# Altium footprint library 6-Connectors-3.PcbLib: 153 footprints (part 6 of 11) (continued)
## PHOENIX_1777099 [mm] "PCB Header, 12A, 320V, Pitch: 5.08mm, 4 Positions, MSTBV Serie" (continued)
  text "1" at -7.76,3.505 h0.75
  text "2" at -2.76,3.505 h0.75
  text "3" at 2.311,3.505 h0.75
  text "4" at 7.366,3.505 h0.75
3D body "PHOENIX_1777099.stp": height 12, standoff -3.9, extent -15.24,-3.8 15.24,4.8

## PHOENIX_1777125 [mm] "PCB Header, 12A, 320V, Pitch: 5.08mm, 7 Positions, MSTBV Serie"
height 12
pads (9):
  round 2.1 hole 1.4: 1(-15.24,0) 2(-10.16,0) 3(-5.08,0) 4(0,0) 5(5.08,0) 6(10.16,0) 7(15.24,0)
  round 3.8 hole 2.4: P1(-20.32,0) P2(20.32,0)
Top Overlay:
  lines w0.2: -22.86,4.23 -16.215,4.23 ; -17.78,-2.2 -17.28,-2.2 ; -17.78,3.093 17.78,3.093 ; -15.884,3.093 -16.215,3.405 ; -14.596,3.093 -14.265,3.405 ; -10.804,3.093 -11.135,3.405 ; -9.516,3.093 -9.185,3.405 ; -5.724,3.093 -6.055,3.405 ; -4.436,3.093 -4.105,3.405 ; -0.644,3.093 -0.975,3.405 ; 0.644,3.093 0.975,3.405 ; 4.436,3.093 4.105,3.405 ; 5.724,3.093 6.055,3.405 ; 9.516,3.093 9.185,3.405 ; 10.804,3.093 11.135,3.405 ; 14.596,3.093 14.265,3.405 ; 15.884,3.093 16.215,3.405 ; 17.78,-2.2 17.28,-2.2 ; 22.86,4.23 16.215,4.23 ; -17.394,-2.5 ccw(c-15.24,0) -13.086,-2.5 ; -17.394,-2.5 -17.28,-2.2 ; -17.394,-2.5 -17.78,-2.5 -17.78,3.405 -16.215,3.405 ; -17.28,-2.2 ccw(c-15.24,0) -13.2,-2.2 ; -16.215,3.405 -16.215,4.23 ; -16.215,4.23 -15.845,4.703 -14.635,4.703 -14.265,4.23 ; -14.265,3.405 -14.265,4.23 ; -14.265,3.405 -11.135,3.405 ; -14.265,4.23 -11.135,4.23 ; -13.2,-2.2 -12.2,-2.2 ; -13.2,-2.2 -13.086,-2.5 ; -13.086,-2.5 -12.314,-2.5 ; -12.314,-2.5 ccw(c-10.16,0) -8.006,-2.5 ; -12.314,-2.5 -12.2,-2.2 ; -12.2,-2.2 ccw(c-10.16,0) -8.12,-2.2 ; -11.135,3.405 -11.135,4.23 ; -11.135,4.23 -10.765,4.703 -9.555,4.703 -9.185,4.23 ; -9.185,3.405 -9.185,4.23 ; -9.185,3.405 -6.055,3.405 ; -9.185,4.23 -6.055,4.23 ; -8.12,-2.2 -8.006,-2.5 ; -8.12,-2.2 -7.12,-2.2 ; -8.006,-2.5 -7.234,-2.5 ; -7.234,-2.5 ccw(c-5.08,0) -2.926,-2.5 ; -7.234,-2.5 -7.12,-2.2 ; -7.12,-2.2 ccw(c-5.08,0) -3.04,-2.2 ; -6.055,3.405 -6.055,4.23 ; -6.055,4.23 -5.685,4.703 -4.475,4.703 -4.105,4.23 ; -4.105,3.405 -4.105,4.23 ; -4.105,3.405 -0.975,3.405 ; -4.105,4.23 -0.975,4.23 ; -3.04,-2.2 -2.926,-2.5 ; -3.04,-2.2 -2.04,-2.2 ; -2.926,-2.5 -2.154,-2.5 ; -2.154,-2.5 ccw(c0,0) 2.154,-2.5 ; -2.154,-2.5 -2.04,-2.2 ; -2.04,-2.2 ccw(c0,0) 2.04,-2.2 ; -0.975,3.405 -0.975,4.23 ; -0.975,4.23 -0.605,4.703 0.605,4.703 0.975,4.23 ; 0.975,3.405 0.975,4.23 ; 0.975,3.405 4.105,3.405 ; 0.975,4.23 4.105,4.23 ; 2.04,-2.2 2.154,-2.5 ; 2.04,-2.2 3.04,-2.2 ; 2.154,-2.5 2.926,-2.5 ; 2.926,-2.5 ccw(c5.08,0) 7.234,-2.5 ; 2.926,-2.5 3.04,-2.2 ; 3.04,-2.2 ccw(c5.08,0) 7.12,-2.2 ; 4.105,3.405 4.105,4.23 ; 4.105,4.23 4.475,4.703 5.685,4.703 6.055,4.23 ; 6.055,3.405 9.185,3.405 ; 6.055,3.405 6.055,4.23 ; 6.055,4.23 9.185,4.23 ; 7.12,-2.2 8.12,-2.2 ; 7.12,-2.2 7.234,-2.5 ; 7.234,-2.5 8.006,-2.5 ; 8.006,-2.5 ccw(c10.16,0) 12.314,-2.5 ; 8.006,-2.5 8.12,-2.2 ; 8.12,-2.2 ccw(c10.16,0) 12.2,-2.2 ; 9.185,3.405 9.185,4.23 ; 9.185,4.23 9.555,4.703 10.765,4.703 11.135,4.23 ; 11.135,3.405 11.135,4.23 ; 11.135,3.405 14.265,3.405 ; 11.135,4.23 14.265,4.23 ; 12.2,-2.2 13.2,-2.2 ; 12.2,-2.2 12.314,-2.5 ; 12.314,-2.5 13.086,-2.5 ; 13.086,-2.5 ccw(c15.24,0) 17.394,-2.5 ; 13.086,-2.5 13.2,-2.2 ; 13.2,-2.2 ccw(c15.24,0) 17.28,-2.2 ; 14.265,3.405 14.265,4.23 ; 14.265,4.23 14.635,4.703 15.845,4.703 16.215,4.23 ; 16.215,3.405 16.215,4.23 ; 16.215,3.405 17.78,3.405 17.78,-2.5 17.394,-2.5 ; 17.28,-2.2 17.394,-2.5 ; -22.86,-3.87 22.86,-3.87 22.86,4.73 -22.86,4.73 -22.86,-3.87 ; -12.901,-0.75 -12.499,-0.75 -12.7,0 -12.901,-0.75 ; -7.821,-0.75 -7.419,-0.75 -7.62,0 -7.821,-0.75 ; -2.741,-0.75 -2.339,-0.75 -2.54,0 -2.741,-0.75 ; 2.339,-0.75 2.741,-0.75 2.54,0 2.339,-0.75 ; 7.419,-0.75 7.821,-0.75 7.62,0 7.419,-0.75 ; 12.499,-0.75 12.901,-0.75 12.7,0 12.499,-0.75
  text "5" at 4.877,3.505 h0.75
  text "4" at -0.254,3.505 h0.75
  text "3" at -5.309,3.505 h0.75
  text "2" at -10.38,3.505 h0.75
  text "1" at -15.38,3.505 h0.75
  text "6" at 9.957,3.505 h0.75
  text "7" at 15.037,3.505 h0.75
Mechanical 8:
  lines w0.1: -20.82,0 -20.32,0 ; -20.32,-0.5 -20.32,0 ; -20.32,0.5 -20.32,0 ; -19.82,0 -20.32,0 ; -15.74,0 -15.24,0 ; -15.24,-0.5 -15.24,0 ; -15.24,0.5 -15.24,0 ; -14.74,0 -15.24,0 ; -10.66,0 -10.16,0 ; -10.16,-0.5 -10.16,0 ; -10.16,0.5 -10.16,0 ; -9.66,0 -10.16,0 ; -5.58,0 -5.08,0 ; -5.08,-0.5 -5.08,0 ; -5.08,0.5 -5.08,0 ; -4.58,0 -5.08,0 ; -0.5,0 0,0 ; 0,-0.5 0,0 ; 0,0.5 0,0 ; 0.5,0 0,0 ; 4.58,0 5.08,0 ; 5.08,-0.5 5.08,0 ; 5.08,0.5 5.08,0 ; 5.58,0 5.08,0 ; 9.66,0 10.16,0 ; 10.16,-0.5 10.16,0 ; 10.16,0.5 10.16,0 ; 10.66,0 10.16,0 ; 14.74,0 15.24,0 ; 15.24,-0.5 15.24,0 ; 15.24,0.5 15.24,0 ; 15.74,0 15.24,0 ; 19.82,0 20.32,0 ; 20.32,-0.5 20.32,0 ; 20.32,0.5 20.32,0 ; 20.82,0 20.32,0
Mechanical 14:
  drawing of 228 lines, arcs and shapes, not listed
  text "7" at 15.037,3.505 h0.75
  text "6" at 9.957,3.505 h0.75
  text "1" at -15.38,3.505 h0.75
  text "2" at -10.38,3.505 h0.75
  text "3" at -5.309,3.505 h0.75
  text "4" at -0.254,3.505 h0.75
  text "5" at 4.877,3.505 h0.75
3D body "PHOENIX_1777125.stp": height 12, standoff -3.9, extent -22.86,-3.8 22.86,4.8

## PHOENIX_1777170 [mm] "PCB Header, 12A, 320V, Pitch: 5.08mm, 12 Positions, MSTBV Serie"
height 12
pads (14):
  round 2.1 hole 1.4: 1(-27.94,0) 2(-22.86,0) 3(-17.78,0) 4(-12.7,0) 5(-7.62,0) 6(-2.54,0) 7(2.54,0) 8(7.62,0) 9(12.7,0) 10(17.78,0) 11(22.86,0) 12(27.94,0)
  round 3.8 hole 2.4: P1(-33.02,0) P2(33.02,0)
Top Overlay:
  drawing of 224 lines, arcs and shapes, not listed
  text "5" at -7.823,3.505 h0.75
  text "4" at -12.954,3.505 h0.75
  text "3" at -18.009,3.505 h0.75
  text "2" at -23.08,3.505 h0.75
  text "1" at -28.08,3.505 h0.75
  text "6" at -2.743,3.505 h0.75
  text "7" at 2.337,3.505 h0.75
  text "8" at 7.391,3.505 h0.75
  text "9" at 12.497,3.505 h0.75
  text "10" at 17.272,3.505 h0.75
  text "11" at 22.479,3.505 h0.75
  text "12" at 27.407,3.505 h0.75
Mechanical 8:
  lines w0.1: -33.52,0 -33.02,0 ; -33.02,-0.5 -33.02,0 ; -33.02,0.5 -33.02,0 ; -32.52,0 -33.02,0 ; -28.44,0 -27.94,0 ; -27.94,-0.5 -27.94,0 ; -27.94,0.5 -27.94,0 ; -27.44,0 -27.94,0 ; -23.36,0 -22.86,0 ; -22.86,-0.5 -22.86,0 ; -22.86,0.5 -22.86,0 ; -22.36,0 -22.86,0 ; -18.28,0 -17.78,0 ; -17.78,-0.5 -17.78,0 ; -17.78,0.5 -17.78,0 ; -17.28,0 -17.78,0 ; -13.2,0 -12.7,0 ; -12.7,-0.5 -12.7,0 ; -12.7,0.5 -12.7,0 ; -12.2,0 -12.7,0 ; -8.12,0 -7.62,0 ; -7.62,-0.5 -7.62,0 ; -7.62,0.5 -7.62,0 ; -7.12,0 -7.62,0 ; -3.04,0 -2.54,0 ; -2.54,-0.5 -2.54,0 ; -2.54,0.5 -2.54,0 ; -2.04,0 -2.54,0 ; -0.5,0 0,0 ; 0,-0.5 0,0 ; 0,0.5 0,0 ; 0.5,0 0,0 ; 2.04,0 2.54,0 ; 2.54,-0.5 2.54,0 ; 2.54,0.5 2.54,0 ; 3.04,0 2.54,0 ; 7.12,0 7.62,0 ; 7.62,-0.5 7.62,0 ; 7.62,0.5 7.62,0 ; 8.12,0 7.62,0 ; 12.2,0 12.7,0 ; 12.7,-0.5 12.7,0 ; 12.7,0.5 12.7,0 ; 13.2,0 12.7,0 ; 17.28,0 17.78,0 ; 17.78,-0.5 17.78,0 ; 17.78,0.5 17.78,0 ; 18.28,0 17.78,0 ; 22.36,0 22.86,0 ; 22.86,-0.5 22.86,0 ; 22.86,0.5 22.86,0 ; 23.36,0 22.86,0 ; 27.44,0 27.94,0 ; 27.94,-0.5 27.94,0 ; 27.94,0.5 27.94,0 ; 28.44,0 27.94,0 ; 32.52,0 33.02,0 ; 33.02,-0.5 33.02,0 ; 33.02,0.5 33.02,0 ; 33.52,0 33.02,0
Mechanical 14:
  drawing of 383 lines, arcs and shapes, not listed
  text "12" at 27.407,3.505 h0.75
  text "11" at 22.479,3.505 h0.75
  text "10" at 17.272,3.505 h0.75
  text "9" at 12.497,3.505 h0.75
  text "8" at 7.391,3.505 h0.75
  text "7" at 2.337,3.505 h0.75
  text "6" at -2.743,3.505 h0.75
  text "1" at -28.08,3.505 h0.75
  text "2" at -23.08,3.505 h0.75
  text "3" at -18.009,3.505 h0.75
  text "4" at -12.954,3.505 h0.75
  text "5" at -7.823,3.505 h0.75
3D body "PHOENIX_1777170.stp": height 12, standoff -3.9, extent -35.56,-3.8 35.56,4.8

## PHOENIX_1777222 [mm] "PCB Header, 12A, 320V, Pitch: 5.08mm, 17 Positions, MSTBV Serie"
height 12
pads (19):
  round 2.1 hole 1.4: 1(-40.64,0) 2(-35.56,0) 3(-30.48,0) 4(-25.4,0) 5(-20.32,0) 6(-15.24,0) 7(-10.16,0) 8(-5.08,0) 9(0,0) 10(5.08,0) 11(10.16,0) 12(15.24,0) 13(20.32,0) 14(25.4,0) 15(30.48,0) 16(35.56,0) 17(40.64,0)
  round 3.8 hole 2.4: P1(-45.72,0) P2(45.72,0)
Top Overlay:
  drawing of 314 lines, arcs and shapes, not listed
  text "5" at -20.523,3.505 h0.75
  text "4" at -25.654,3.505 h0.75
  text "3" at -30.709,3.505 h0.75
  text "2" at -35.78,3.505 h0.75
  text "1" at -40.78,3.505 h0.75
  text "6" at -15.443,3.505 h0.75
  text "7" at -10.363,3.505 h0.75
  text "8" at -5.309,3.505 h0.75
  text "9" at -0.203,3.505 h0.75
  text "10" at 4.572,3.505 h0.75
  text "11" at 9.779,3.505 h0.75
  text "12" at 14.707,3.505 h0.75
  text "17" at 40.132,3.505 h0.75
  text "16" at 35.052,3.505 h0.75
  text "15" at 29.972,3.505 h0.75
  text "14" at 24.917,3.505 h0.75
  text "13" at 19.787,3.505 h0.75
Mechanical 8:
  lines w0.1: -46.22,0 -45.72,0 ; -45.72,-0.5 -45.72,0 ; -45.72,0.5 -45.72,0 ; -45.22,0 -45.72,0 ; -41.14,0 -40.64,0 ; -40.64,-0.5 -40.64,0 ; -40.64,0.5 -40.64,0 ; -40.14,0 -40.64,0 ; -36.06,0 -35.56,0 ; -35.56,-0.5 -35.56,0 ; -35.56,0.5 -35.56,0 ; -35.06,0 -35.56,0 ; -30.98,0 -30.48,0 ; -30.48,-0.5 -30.48,0 ; -30.48,0.5 -30.48,0 ; -29.98,0 -30.48,0 ; -25.9,0 -25.4,0 ; -25.4,-0.5 -25.4,0 ; -25.4,0.5 -25.4,0 ; -24.9,0 -25.4,0 ; -20.82,0 -20.32,0 ; -20.32,-0.5 -20.32,0 ; -20.32,0.5 -20.32,0 ; -19.82,0 -20.32,0 ; -15.74,0 -15.24,0 ; -15.24,-0.5 -15.24,0 ; -15.24,0.5 -15.24,0 ; -14.74,0 -15.24,0 ; -13.2,0 -12.7,0 ; -12.7,-0.5 -12.7,0 ; -12.7,0.5 -12.7,0 ; -12.2,0 -12.7,0 ; -10.66,0 -10.16,0 ; -10.16,-0.5 -10.16,0 ; -10.16,0.5 -10.16,0 ; -9.66,0 -10.16,0 ; -5.58,0 -5.08,0 ; -5.08,-0.5 -5.08,0 ; -5.08,0.5 -5.08,0 ; -4.58,0 -5.08,0 ; -0.5,0 0,0 ; 0,-0.5 0,0 ; 0,0.5 0,0 ; 0.5,0 0,0 ; 4.58,0 5.08,0 ; 5.08,-0.5 5.08,0 ; 5.08,0.5 5.08,0 ; 5.58,0 5.08,0 ; 9.66,0 10.16,0 ; 10.16,-0.5 10.16,0 ; 10.16,0.5 10.16,0 ; 10.66,0 10.16,0 ; 14.74,0 15.24,0 ; 15.24,-0.5 15.24,0 ; 15.24,0.5 15.24,0 ; 15.74,0 15.24,0 ; 19.82,0 20.32,0 ; 20.32,-0.5 20.32,0 ; 20.32,0.5 20.32,0 ; 20.82,0 20.32,0 ; 24.9,0 25.4,0 ; 25.4,-0.5 25.4,0 ; 25.4,0.5 25.4,0 ; 25.9,0 25.4,0 ; 29.98,0 30.48,0 ; 30.48,-0.5 30.48,0 ; 30.48,0.5 30.48,0 ; 30.98,0 30.48,0 ; 35.06,0 35.56,0 ; 35.56,-0.5 35.56,0 ; 35.56,0.5 35.56,0 ; 36.06,0 35.56,0 ; 40.14,0 40.64,0 ; 40.64,-0.5 40.64,0 ; 40.64,0.5 40.64,0 ; 41.14,0 40.64,0 ; 45.22,0 45.72,0 ; 45.72,-0.5 45.72,0 ; 45.72,0.5 45.72,0 ; 46.22,0 45.72,0
Mechanical 14:
  drawing of 538 lines, arcs and shapes, not listed
  text "13" at 19.787,3.505 h0.75
  text "14" at 24.917,3.505 h0.75
  text "15" at 29.972,3.505 h0.75
  text "16" at 35.052,3.505 h0.75
  text "17" at 40.132,3.505 h0.75
  text "12" at 14.707,3.505 h0.75
  text "11" at 9.779,3.505 h0.75
  text "10" at 4.572,3.505 h0.75
  text "9" at -0.203,3.505 h0.75
  text "8" at -5.309,3.505 h0.75
  text "7" at -10.363,3.505 h0.75
  text "6" at -15.443,3.505 h0.75
  text "1" at -40.78,3.505 h0.75
  text "2" at -35.78,3.505 h0.75
  text "3" at -30.709,3.505 h0.75
  text "4" at -25.654,3.505 h0.75
  text "5" at -20.523,3.505 h0.75
3D body "PHOENIX_1777222.stp": height 12, standoff -3.9, extent -48.26,-3.8 48.26,4.8

## PHOENIX_1777251 [mm] "PCB Header, 12A, 320V, Pitch: 5.08mm, 20 Positions, MSTBV Serie"
height 12
pads (22):
  round 2.1 hole 1.4: 1(-48.26,0) 2(-43.18,0) 3(-38.1,0) 4(-33.02,0) 5(-27.94,0) 6(-22.86,0) 7(-17.78,0) 8(-12.7,0) 9(-7.62,0) 10(-2.54,0) 11(2.54,0) 12(7.62,0) 13(12.7,0) 14(17.78,0) 15(22.86,0) 16(27.94,0) 17(33.02,0) 18(38.1,0) 19(43.18,0) 20(48.26,0)
  round 3.8 hole 2.4: P1(-53.34,0) P2(53.34,0)
Top Overlay:
  drawing of 368 lines, arcs and shapes, not listed
  text "20" at 47.701,3.505 h0.75
  text "19" at 42.672,3.505 h0.75
  text "18" at 37.567,3.505 h0.75
  text "5" at -28.143,3.505 h0.75
  text "4" at -33.274,3.505 h0.75
  text "3" at -38.329,3.505 h0.75
  text "2" at -43.4,3.505 h0.75
  text "1" at -48.4,3.505 h0.75
  text "6" at -23.063,3.505 h0.75
  text "7" at -17.983,3.505 h0.75
  text "8" at -12.929,3.505 h0.75
  text "9" at -7.823,3.505 h0.75
  text "10" at -3.048,3.505 h0.75
  text "11" at 2.159,3.505 h0.75
  text "12" at 7.087,3.505 h0.75
  text "17" at 32.512,3.505 h0.75
  text "16" at 27.432,3.505 h0.75
  text "15" at 22.352,3.505 h0.75
  text "14" at 17.297,3.505 h0.75
  text "13" at 12.167,3.505 h0.75
Mechanical 8:
  lines w0.1: -53.84,0 -53.34,0 ; -53.34,-0.5 -53.34,0 ; -53.34,0.5 -53.34,0 ; -52.84,0 -53.34,0 ; -48.76,0 -48.26,0 ; -48.26,-0.5 -48.26,0 ; -48.26,0.5 -48.26,0 ; -47.76,0 -48.26,0 ; -43.68,0 -43.18,0 ; -43.18,-0.5 -43.18,0 ; -43.18,0.5 -43.18,0 ; -42.68,0 -43.18,0 ; -38.6,0 -38.1,0 ; -38.1,-0.5 -38.1,0 ; -38.1,0.5 -38.1,0 ; -37.6,0 -38.1,0 ; -33.52,0 -33.02,0 ; -33.02,-0.5 -33.02,0 ; -33.02,0.5 -33.02,0 ; -32.52,0 -33.02,0 ; -28.44,0 -27.94,0 ; -27.94,-0.5 -27.94,0 ; -27.94,0.5 -27.94,0 ; -27.44,0 -27.94,0 ; -23.36,0 -22.86,0 ; -22.86,-0.5 -22.86,0 ; -22.86,0.5 -22.86,0 ; -22.36,0 -22.86,0 ; -20.82,0 -20.32,0 ; -20.32,-0.5 -20.32,0 ; -20.32,0.5 -20.32,0 ; -19.82,0 -20.32,0 ; -18.28,0 -17.78,0 ; -17.78,-0.5 -17.78,0 ; -17.78,0.5 -17.78,0 ; -17.28,0 -17.78,0 ; -13.2,0 -12.7,0 ; -12.7,-0.5 -12.7,0 ; -12.7,0.5 -12.7,0 ; -12.2,0 -12.7,0 ; -8.12,0 -7.62,0 ; -7.62,-0.5 -7.62,0 ; -7.62,0.5 -7.62,0 ; -7.12,0 -7.62,0 ; -3.04,0 -2.54,0 ; -2.54,-0.5 -2.54,0 ; -2.54,0.5 -2.54,0 ; -2.04,0 -2.54,0 ; 2.04,0 2.54,0 ; 2.54,-0.5 2.54,0 ; 2.54,0.5 2.54,0 ; 3.04,0 2.54,0 ; 7.12,0 7.62,0 ; 7.62,-0.5 7.62,0 ; 7.62,0.5 7.62,0 ; 8.12,0 7.62,0 ; 12.2,0 12.7,0 ; 12.7,-0.5 12.7,0 ; 12.7,0.5 12.7,0 ; 13.2,0 12.7,0 ; 17.28,0 17.78,0 ; 17.78,-0.5 17.78,0 ; 17.78,0.5 17.78,0 ; 18.28,0 17.78,0 ; 22.36,0 22.86,0 ; 22.86,-0.5 22.86,0 ; 22.86,0.5 22.86,0 ; 23.36,0 22.86,0 ; 27.44,0 27.94,0 ; 27.94,-0.5 27.94,0 ; 27.94,0.5 27.94,0 ; 28.44,0 27.94,0 ; 32.52,0 33.02,0 ; 33.02,-0.5 33.02,0 ; 33.02,0.5 33.02,0 ; 33.52,0 33.02,0 ; 37.6,0 38.1,0 ; 38.1,-0.5 38.1,0 ; 38.1,0.5 38.1,0 ; 38.6,0 38.1,0 ; 42.68,0 43.18,0 ; 43.18,-0.5 43.18,0 ; 43.18,0.5 43.18,0 ; 43.68,0 43.18,0 ; 47.76,0 48.26,0 ; 48.26,-0.5 48.26,0 ; 48.26,0.5 48.26,0 ; 48.76,0 48.26,0 ; 52.84,0 53.34,0 ; 53.34,-0.5 53.34,0 ; 53.34,0.5 53.34,0 ; 53.84,0 53.34,0
Mechanical 14:
  drawing of 631 lines, arcs and shapes, not listed
  text "13" at 12.167,3.505 h0.75
  text "14" at 17.297,3.505 h0.75
  text "15" at 22.352,3.505 h0.75
  text "16" at 27.432,3.505 h0.75
  text "17" at 32.512,3.505 h0.75
  text "12" at 7.087,3.505 h0.75
  text "11" at 2.159,3.505 h0.75
  text "10" at -3.048,3.505 h0.75
  text "9" at -7.823,3.505 h0.75
  text "8" at -12.929,3.505 h0.75
  text "7" at -17.983,3.505 h0.75
  text "6" at -23.063,3.505 h0.75
  text "1" at -48.4,3.505 h0.75
  text "2" at -43.4,3.505 h0.75
  text "3" at -38.329,3.505 h0.75
  text "4" at -33.274,3.505 h0.75
  text "5" at -28.143,3.505 h0.75
  text "18" at 37.567,3.505 h0.75
  text "19" at 42.672,3.505 h0.75
  text "20" at 47.701,3.505 h0.75
3D body "PHOENIX_1777251.stp": height 12, standoff -3.9, extent -55.88,-3.8 55.88,4.8

## PHOENIX_1785968 [mm] "PCB Header, 12A, 320V, Pitch: 5.08mm, 4 Positions, ICV Serie"
height 19
pads (8):
  round 2.1 hole 1.4: 1(-7.62,-2.54) 1(-7.62,2.54) 2(-2.54,-2.54) 2(-2.54,2.54) 3(2.54,-2.54) 3(2.54,2.54) 4(7.62,-2.54) 4(7.62,2.54)
Top Overlay:
  circle w0.2: c7.62,0.015 r0.7
  circle w0.2: c2.54,0.015 r0.7
  circle w0.2: c-2.54,0.015 r0.7
  circle w0.2: c-7.62,0.015 r0.7
  lines w0.2: -11.16,-4.1 -6.68,-4.1 -6.68,-6.3 -5.08,-6.3 -5.08,-4.1 5.08,-4.1 5.08,-6.3 6.68,-6.3 6.68,-4.1 11.16,-4.1 ; -11.16,-2.136 -10.16,-2.5 ; -11.16,2.136 -10.16,2.5 -10.16,-2.9 -9.025,-2.9 ; -10.16,-4.4 -10.16,-4.65 -9.32,-4.65 -9.32,-4.4 ; -10.16,2.015 -9.741,2.015 cw(c-7.62,0.015) -9.07,2.544 ; -8.281,1.249 ccw(c-7.62,0.015) -8.32,1.227 -8.32,-1.197 ccw(c-7.62,0.015) -8.251,-1.235 ; -6.989,-1.235 ccw(c-7.62,0.015) -6.959,1.249 ; -6.92,-4.412 -6.92,-4.65 -6.68,-4.65 ; -6.68,-4.4 -11.16,-4.4 -11.16,3.9 11.16,3.9 11.16,-4.4 6.68,-4.4 ; -6.215,-2.9 -3.945,-2.9 ; -6.17,2.544 cw(c-7.62,0.015) -5.499,2.015 -4.661,2.015 cw(c-2.54,0.015) -3.99,2.544 ; -5.08,-4.65 -4.24,-4.65 -4.24,-4.4 ; -5.08,-4.4 5.08,-4.4 ; -3.201,1.249 ccw(c-2.54,0.015) -3.171,-1.235 ; -1.909,-1.235 ccw(c-2.54,0.015) -1.879,1.249 ; -1.84,-4.4 -1.84,-4.65 0.84,-4.65 0.84,-4.4 ; -1.135,-2.9 1.135,-2.9 ; -1.09,2.544 cw(c-2.54,0.015) -0.419,2.015 0.419,2.015 cw(c2.54,0.015) 1.09,2.544 ; 1.879,1.249 ccw(c2.54,0.015) 1.909,-1.235 ; 3.171,-1.235 ccw(c2.54,0.015) 3.201,1.249 ; 3.24,-4.4 3.24,-4.65 5.08,-4.65 ; 3.945,-2.9 6.215,-2.9 ; 3.99,2.544 cw(c2.54,0.015) 4.661,2.015 5.499,2.015 cw(c7.62,0.015) 6.17,2.544 ; 6.959,1.249 ccw(c7.62,0.015) 6.989,-1.235 ; 8.251,-1.235 ccw(c7.62,0.015) 8.281,1.249 ; 8.32,-4.414 8.32,-4.65 10.16,-4.65 10.16,-4.4 ; 9.025,-2.9 10.16,-2.9 10.16,2.5 11.16,2.136 ; 9.07,2.544 cw(c7.62,0.015) 9.741,2.015 10.16,2.015 ; 10.16,-2.5 11.16,-2.136 ; -5.281,-0.735 -4.879,-0.735 -5.08,0.015 -5.281,-0.735 ; -0.201,-0.735 0.201,-0.735 0,0 -0.201,-0.735 ; 4.879,-0.735 5.281,-0.735 5.08,0.015 4.879,-0.735
  text "4" at 7.266,-6.18 h1
  text "1" at -7.735,-6.18 h1
  text "1" at -9.46,-0.58 h1
Mechanical 8:
  lines w0.1: -8.12,-2.54 -7.62,-2.54 ; -8.12,2.54 -7.62,2.54 ; -7.62,-3.04 -7.62,-2.54 ; -7.62,-2.04 -7.62,-2.54 ; -7.62,2.04 -7.62,2.54 ; -7.62,3.04 -7.62,2.54 ; -7.12,-2.54 -7.62,-2.54 ; -7.12,2.54 -7.62,2.54 ; -3.04,-2.54 -2.54,-2.54 ; -3.04,2.54 -2.54,2.54 ; -2.54,-3.04 -2.54,-2.54 ; -2.54,-2.04 -2.54,-2.54 ; -2.54,2.04 -2.54,2.54 ; -2.54,3.04 -2.54,2.54 ; -2.04,-2.54 -2.54,-2.54 ; -2.04,2.54 -2.54,2.54 ; -0.5,0 0,0 ; 0,-0.5 0,0 ; 0,0.5 0,0 ; 0.5,0 0,0 ; 2.04,-2.54 2.54,-2.54 ; 2.04,2.54 2.54,2.54 ; 2.54,-3.04 2.54,-2.54 ; 2.54,-2.04 2.54,-2.54 ; 2.54,2.04 2.54,2.54 ; 2.54,3.04 2.54,2.54 ; 3.04,-2.54 2.54,-2.54 ; 3.04,2.54 2.54,2.54 ; 7.12,-2.54 7.62,-2.54 ; 7.12,2.54 7.62,2.54 ; 7.62,-3.04 7.62,-2.54 ; 7.62,-2.04 7.62,-2.54 ; 7.62,2.04 7.62,2.54 ; 7.62,3.04 7.62,2.54 ; 8.12,-2.54 7.62,-2.54 ; 8.12,2.54 7.62,2.54
Mechanical 14:
  circle w0.1: c7.62,0.015 r1.4
  circle w0.1: c7.62,0.015 r0.7
  circle w0.1: c2.54,0.015 r1.4
  circle w0.1: c2.54,0.015 r0.7
  circle w0.1: c-2.54,0.015 r1.4
  circle w0.1: c-2.54,0.015 r0.7
  circle w0.1: c-7.62,0.015 r0.7
  lines w0.1: -11.16,-4.1 -6.68,-4.1 -6.68,-6.3 -5.08,-6.3 -5.08,-4.1 5.08,-4.1 5.08,-6.3 6.68,-6.3 6.68,-4.1 11.16,-4.1 ; -11.16,-2.136 -10.16,-2.5 ; -11.16,2.136 -10.16,2.5 -10.16,-2.9 -8.875,-2.9 -9.11,-2.22 -6.13,-2.22 -6.365,-2.9 -3.795,-2.9 -4.03,-2.22 -1.05,-2.22 -1.285,-2.9 1.285,-2.9 1.05,-2.22 4.03,-2.22 3.795,-2.9 6.365,-2.9 6.13,-2.22 9.11,-2.22 8.875,-2.9 10.16,-2.9 10.16,2.5 11.16,2.136 ; -10.16,-4.4 -10.16,-4.65 -9.32,-4.65 -9.32,-4.4 ; -10.16,2.015 -9.741,2.015 cw(c-7.62,0.015) -5.499,2.015 -4.661,2.015 cw(c-2.54,0.015) -0.419,2.015 0.419,2.015 cw(c2.54,0.015) 4.661,2.015 5.499,2.015 cw(c7.62,0.015) 9.741,2.015 10.16,2.015 ; -6.92,-4.412 -6.92,-4.65 -6.68,-4.65 ; -6.68,-4.4 -11.16,-4.4 -11.16,3.9 11.16,3.9 11.16,-4.4 6.68,-4.4 ; -5.08,-4.65 -4.24,-4.65 -4.24,-4.4 ; -5.08,-4.4 5.08,-4.4 ; -1.84,-4.4 -1.84,-4.65 0.84,-4.65 0.84,-4.4 ; 3.24,-4.4 3.24,-4.65 5.08,-4.65 ; 8.32,-4.414 8.32,-4.65 10.16,-4.65 10.16,-4.4 ; 10.16,-2.5 11.16,-2.136 ; -8.32,-1.197 ccw(c-7.62,0.015) -8.32,1.227 -8.32,-1.197 ; -5.281,-0.735 -4.879,-0.735 -5.08,0.015 -5.281,-0.735 ; -0.201,-0.735 0.201,-0.735 0,0 -0.201,-0.735 ; 4.879,-0.735 5.281,-0.735 5.08,0.015 4.879,-0.735
  text "4" at 7.266,-6.18 h1
  text "1" at -7.735,-6.18 h1
  text "1" at -9.46,-0.58 h1
3D body "PHOENIX_1785968.stp": height 19, standoff -3.6, extent -11.16,-6.3 11.16,3.9

## PHOENIX_1803426 [mm] "PCB Header, 8A, 160 V, Pitch: 3.81mm, 2 Positions, MCV Serie"
height 9.2
pads (2):
  round 1.9 hole 1.2: 1(-1.905,0) 2(1.905,0)
Top Overlay:
  lines w0.2: -4.505,4 4.505,4 ; -3.61,-2.3 -2.805,-2.3 ; -3.61,2 -2.305,2 -2.305,2.47 ccw(c-2.505,2.47) -2.505,2.67 ; -3.608,3.9 -3.609,3.9 ; -3.608,4 -3.609,4 -3.609,3.9 ; -2.305,2.134 -3.61,2.134 -3.61,-2.434 -2.759,-2.434 ; -1.505,2.134 -0.2,2.134 -0.2,-2.434 -1.051,-2.434 ; -1.305,2.67 ccw(c-1.305,2.47) -1.505,2.47 -1.505,2 -0.2,2 ; -0.201,4 -0.2,4 -0.2,3.9 -0.201,3.9 -3.609,3.9 ; -0.2,-2.3 -1.005,-2.3 ; 0.2,-2.3 1.005,-2.3 ; 0.2,2 1.505,2 1.505,2.47 ccw(c1.305,2.47) 1.305,2.67 ; 0.202,3.9 0.201,3.9 ; 0.202,4 0.201,4 0.201,3.9 ; 1.505,2.134 0.2,2.134 0.2,-2.434 1.051,-2.434 ; 2.305,2.134 3.61,2.134 3.61,-2.434 2.759,-2.434 ; 2.505,2.67 ccw(c2.505,2.47) 2.305,2.47 2.305,2 3.61,2 ; 3.609,4 3.61,4 3.61,3.9 3.609,3.9 0.201,3.9 ; 3.61,-2.3 2.805,-2.3 ; -2.805,-2.3 cw(c-1.905,-3.5) -1.005,-2.3 ; -2.805,-2.3 -2.794,-2.334 -2.782,-2.367 ccw(c5.266,0.384) -2.759,-2.434 ; -2.759,-2.434 cw(c-1.905,-3.5) -1.051,-2.434 ; -1.051,-2.434 -1.039,-2.401 -1.028,-2.367 ccw(c-9.737,0.61) -1.005,-2.3 ; 1.005,-2.3 cw(c1.905,-3.5) 2.805,-2.3 ; 1.005,-2.3 1.016,-2.334 1.028,-2.367 ccw(c9.076,0.384) 1.051,-2.434 ; 1.051,-2.434 cw(c1.905,-3.5) 2.759,-2.434 ; 2.759,-2.434 2.771,-2.401 2.782,-2.367 ccw(c-5.927,0.61) 2.805,-2.3 ; -4.505,-3 4.505,-3 4.505,4.25 -4.505,4.25 -4.505,-3 ; -3.395,3.35 -0.415,3.35 -0.65,2.67 -3.16,2.67 -3.395,3.35 ; -0.188,-0.7 0.188,-0.7 0,0 -0.188,-0.7 ; 0.415,3.35 3.395,3.35 3.16,2.67 0.65,2.67 0.415,3.35
  text "2" at 1.63,4.6 h1
  text "1" at -2.18,4.6 h1
Mechanical 8:
  lines w0.1: -2.405,0 -1.905,0 ; -1.905,-0.5 -1.905,0 ; -1.905,0.5 -1.905,0 ; -1.405,0 -1.905,0 ; -0.5,0 0,0 ; 0,-0.5 0,0 ; 0,0.5 0,0 ; 0.5,0 0,0 ; 1.405,0 1.905,0 ; 1.905,-0.5 1.905,0 ; 1.905,0.5 1.905,0 ; 2.405,0 1.905,0
Mechanical 14:
  lines w0.1: -4.505,4 4.505,4 ; -3.61,-2.3 -2.805,-2.3 ; -3.61,2 -2.305,2 -2.305,2.47 ccw(c-2.505,2.47) -2.505,2.67 ; -3.608,3.9 -3.609,3.9 ; -3.608,4 -3.609,4 -3.609,3.9 ; -2.305,2.134 -3.61,2.134 -3.61,-2.434 -2.759,-2.434 ; -1.505,2.134 -0.2,2.134 -0.2,-2.434 -1.051,-2.434 ; -1.305,2.67 ccw(c-1.305,2.47) -1.505,2.47 -1.505,2 -0.2,2 ; -0.201,4 -0.2,4 -0.2,3.9 -0.201,3.9 -3.609,3.9 ; -0.2,-2.3 -1.005,-2.3 ; 0.2,-2.3 1.005,-2.3 ; 0.2,2 1.505,2 1.505,2.47 ccw(c1.305,2.47) 1.305,2.67 ; 0.202,3.9 0.201,3.9 ; 0.202,4 0.201,4 0.201,3.9 ; 1.505,2.134 0.2,2.134 0.2,-2.434 1.051,-2.434 ; 2.305,2.134 3.61,2.134 3.61,-2.434 2.759,-2.434 ; 2.505,2.67 ccw(c2.505,2.47) 2.305,2.47 2.305,2 3.61,2 ; 3.609,4 3.61,4 3.61,3.9 3.609,3.9 0.201,3.9 ; 3.61,-2.3 2.805,-2.3 ; -2.805,-2.3 cw(c-1.905,-3.5) -1.005,-2.3 ; -2.805,-2.3 -2.794,-2.334 -2.782,-2.367 ccw(c5.266,0.384) -2.759,-2.434 ; -2.759,-2.434 cw(c-1.905,-3.5) -1.051,-2.434 ; -1.051,-2.434 -1.039,-2.401 -1.028,-2.367 ccw(c-9.737,0.61) -1.005,-2.3 ; 1.005,-2.3 cw(c1.905,-3.5) 2.805,-2.3 ; 1.005,-2.3 1.016,-2.334 1.028,-2.367 ccw(c9.076,0.384) 1.051,-2.434 ; 1.051,-2.434 cw(c1.905,-3.5) 2.759,-2.434 ; 2.759,-2.434 2.771,-2.401 2.782,-2.367 ccw(c-5.927,0.61) 2.805,-2.3 ; -4.505,-3 4.505,-3 4.505,4.25 -4.505,4.25 -4.505,-3 ; -3.395,3.35 -0.415,3.35 -0.65,2.67 -3.16,2.67 -3.395,3.35 ; -2.405,-0.625 ccw(c-1.905,0) -2.405,0.625 -2.405,-0.624 ; -2.305,-0.4 -2.305,0.4 -1.505,0.4 -1.505,-0.4 -2.305,-0.4 ; -0.188,-0.7 0.188,-0.7 0,0 -0.188,-0.7 ; 0.415,3.35 3.395,3.35 3.16,2.67 0.65,2.67 0.415,3.35 ; 1.405,-0.625 ccw(c1.905,0) 1.405,0.625 1.405,-0.624 ; 1.505,-0.4 1.505,0.4 2.305,0.4 2.305,-0.4 1.505,-0.4
3D body "PHOENIX_1803426.stp": height 9.2, standoff -3.4, extent -4.505,-3 4.505,4.25